# Altium footprint library JL_PCB.PCBLIB: 1112 footprints (part 20 of 71)
Each footprint in its own frame and in the unit in brackets; x right, y up, seen from the top. Pads: shape width x height; smd on the part's side, far side on the other; paste and mask are expansions set on the pad; w line width, h text height; cw(c..) or ccw(c..) is an arc to the next point about the centre after c.
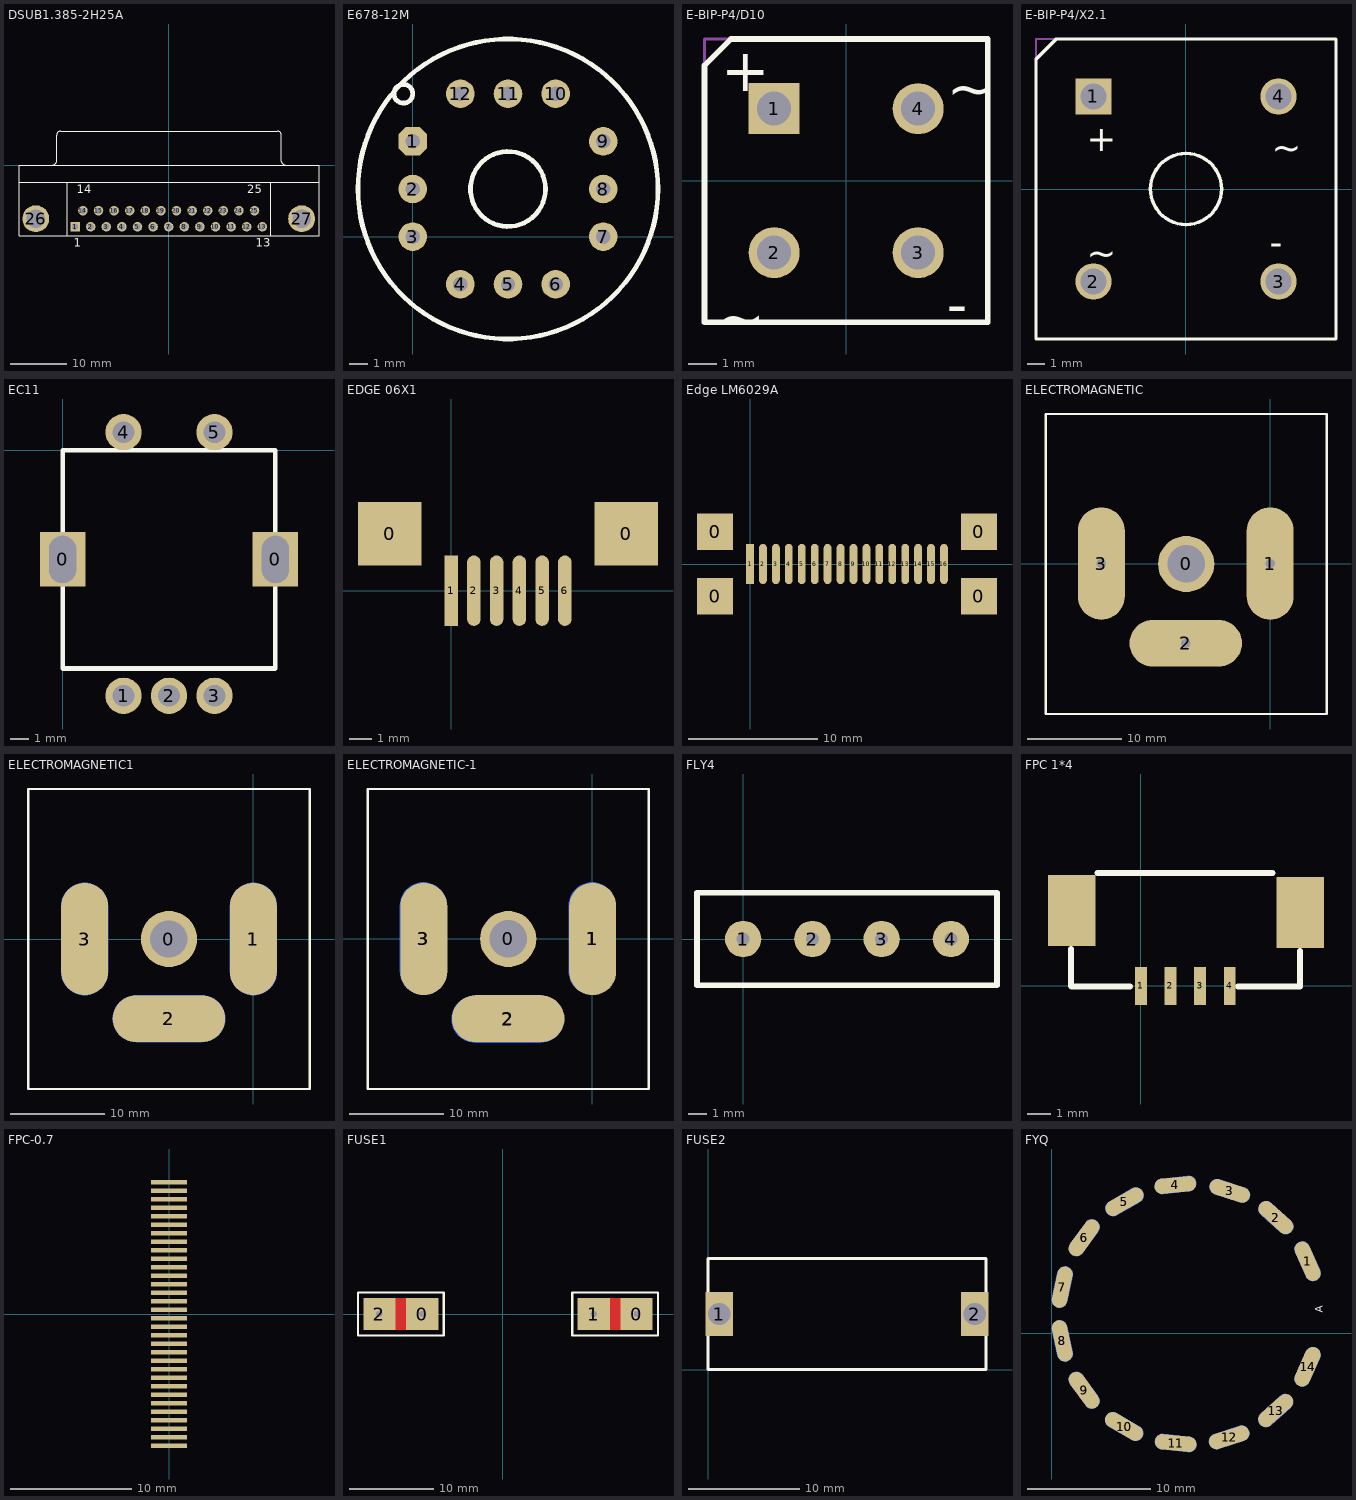
[diagram p19: the footprints below, top view; thin cyan lines are the x and y axes]

## DSUB1.385-2H25A [mm] "Connector; D Subminiature; 25 Position; Right Angle; Pitch 1.385 mm"
height 12.93
pads (27):
  rect 1.69x1.69 hole 1.09: 1(-16.566,-10.92)
  round 1.69 hole 1.09: 2(-13.805,-10.92) 3(-11.044,-10.92) 4(-8.283,-10.92) 5(-5.522,-10.92) 6(-2.761,-10.92) 7(0,-10.92) 8(2.761,-10.92) 9(5.522,-10.92) 10(8.283,-10.92) 11(11.044,-10.92) 12(13.805,-10.92) 13(16.566,-10.92) 14(-15.185,-8.08) 15(-12.424,-8.08) 16(-9.663,-8.08) 17(-6.902,-8.08) 18(-4.141,-8.08) 19(-1.38,-8.08) 20(1.381,-8.08) 21(4.142,-8.08) 22(6.903,-8.08) 23(9.664,-8.08) 24(12.425,-8.08) 25(15.186,-8.08)
  round 4.76 hole 3.26: 26(-23.526,-9.5) 27(23.526,-9.5)
TopOverlay:
  lines w0.2: -26.496,-3 26.604,-3 ; -20.541,0.005 ccw(c-20.541,0.7) -19.846,0.7 -19.846,5.3 ; -19.841,5.305 cw(c-19.146,5.305) -19.146,6 19.254,6 cw(c19.254,5.305) 19.949,5.305 ; -17.946,-12.5 -17.946,-3 ; 18.054,-12.5 18.054,-3 ; 19.954,5.3 19.954,0.7 ccw(c20.649,0.7) 20.649,0.005 ; -26.496,-12.5 -26.496,0 26.604,0 26.604,-12.5 -26.496,-12.5
  text "25" at 13.936,-4.975 h1.5
  text "14" at -16.31,-4.975 h1.5
  text "13" at 15.441,-14.475 h1.5
  text "1" at -16.816,-14.475 h1.5

## E678-12M [mil]
pads (12):
  oct 60x60 hole 30: 1(0,200)
  round 60 hole 30: 2(0,100) 3(0,0) 4(100,-100) 5(200,-100) 6(300,-100) 7(400,0) 8(400,100) 9(400,200) 10(300,300) 11(200,300) 12(100,300)
TopOverlay:
  circle w10: c200,100 r78.74
  circle w10: c-19.68,300 r19.68
  circle w10: c200,100 r314.96
3D body "User Library-Hamamatsu 6357 PMT Socket.step": height 403.36, standoff -143.49, extent -47.88,-145.88 441.88,343.89

## E-BIP-P4/D10 [mm] "Bridge Rectifier; 4 Terminals; Body 9.4 x 9.4 mm (typ); Pitch 5.08 mm"
height 9.91
pads (4):
  rect 1.8x1.8 hole 1.2: 1(-2.54,2.54)
  round 1.8 hole 1.2: 2(-2.54,-2.54) 3(2.54,-2.54) 4(2.54,2.54)
TopOverlay:
  lines w0.2: -5,-5 -5,4.064 -4.064,5 5,5 5,-5 -5,-5
  text "+" at -4.41,3.164 h1.5
  text "-" at 3.556,-5.08 h1.5
  text "~" at -4.572,-5.588 h1.5
  text "~" at 3.556,2.54 h1.5
Mechanical13:
  lines w0.1: -5,-5 -5,5 5,5 5,-5 -5,-5
3D body: height 9.91, standoff 0, extent -5,-5 5,5

## E-BIP-P4/X2.1 [mm] "Bridge Rectifier; 4 Terminals; Body 16.8 x 16.8 mm (typ); Pitch 10.67 mm"
height 6.35
pads (4):
  rect 2.1x2.1 hole 1.5: 1(-5.335,5.335)
  round 2.1 hole 1.5: 2(-5.335,-5.335) 3(5.335,-5.335) 4(5.335,5.335)
TopOverlay:
  circle w0.2: c0,0 r2.05
  lines w0.2: -8.65,-8.65 -8.65,7.474 -7.474,8.65 8.65,8.65 8.65,-8.65 -8.65,-8.65
  text "+" at -5.723,2.167 h1.5
  text "-" at 4.825,-3.809 h1.5
  text "~" at 4.945,1.659 h1.5
  text "~" at -5.723,-4.437 h1.5
Mechanical13:
  lines w0.1: -8.65,-8.65 8.65,-8.65 8.65,8.65 -8.65,8.65 -8.65,-8.65
3D body: height 6.35, standoff 0, extent -8.65,-8.65 8.65,8.65

## EC11 [mm]
pads (7):
  rect 2.5x3 hole 1.5 slot 2.6 at 90 deg: 0(0,-6) 0(11.7,-6)
  round 2 hole 1.2: 1(3.35,-13.5) 2(5.85,-13.5) 3(8.35,-13.5) 4(3.35,1) 5(8.35,1)
TopOverlay:
  lines w0.254: 0,-12 0,0 11.7,0 11.7,-12 0,-12
3D body "EC11.STEP": height 20.69, standoff -3.58, extent -0.21,-13.311 12.3,0.889

## EDGE 06X1 [mm]
pads (8):
  rect 2.8x2.8 smd: 0(-2.7,2.5) 0(7.7,2.5)
  rect 0.6x3.1 smd: 1(0,0)
  oval 0.6x3.1 smd: 2(1,0) 3(2,0) 4(3,0) 5(4,0) 6(5,0)

## Edge LM6029A [mm]
pads (20):
  rect 2.8x2.8 smd: 0(-2.7,-2.5) 0(-2.7,2.5) 0(17.7,-2.5) 0(17.7,2.5)
  rect 0.6x3.1 smd: 1(0,0)
  oval 0.6x3.1 smd: 2(1,0) 3(2,0) 4(3,0) 5(4,0) 6(5,0) 7(6,0) 8(7,0) 9(8,0) 10(9,0) 11(10,0) 12(11,0) 13(12,0) 14(13,0) 15(14,0) 16(15,0)

## ELECTROMAGNETIC [mm]
pads (4):
  round 6 hole 4: 0(-8.95,-0.05)
  oval 5x12 hole 1: 1(0,0) 3(-18,0)
  oval 12x5 hole 1: 2(-9,-8.5)
TopOverlay:
  lines w0.254: -23.95,-16.05 -23.95,15.95 6.05,15.95 6.05,-16.05 -23.95,-16.05
Mechanical1:
  lines w0.254: -18.45,3.9 -17.45,3.9 ; -12.7,-9.04 -12.7,-8.04 ; -0.5,3.5 0.5,3.5 ; -17.2,3.9 -18.7,3.9 -19.2,3.4 -19.2,-3.1 -19.2,-3.35 -18.7,-3.85 -17.2,-3.85 -16.7,-3.35 -16.7,3.4 ; -17.2,3.9 -16.7,3.4 ; -17.2,3.9 -16.7,3.4 ; -17.2,3.9 -16.7,3.4 ; -12.7,-7.79 -12.7,-9.29 -12.2,-9.79 -5.7,-9.79 -5.45,-9.79 -4.95,-9.29 -4.95,-7.79 -5.45,-7.29 -12.2,-7.29 ; -12.7,-7.79 -12.2,-7.29 ; -12.7,-7.79 -12.2,-7.29 ; -12.7,-7.79 -12.2,-7.29 ; 0.75,3.5 -0.75,3.5 -1.25,3 -1.25,-3.5 -1.25,-3.75 -0.75,-4.25 0.75,-4.25 1.25,-3.75 1.25,3 ; 0.75,3.5 1.25,3 ; 0.75,3.5 1.25,3 ; 0.75,3.5 1.25,3

## ELECTROMAGNETIC1 [mm]
pads (7):
  round 6 hole 4: 0(-9,0)
  oval 5x12 smd: 1(0,0) 3(-18,0)
  oval 5x12 smd far side: 1(0,0) 3(-18,0)
  oval 12x5 smd: 2(-9,-8.5)
  oval 12x5 smd far side: 2(-9,-8.5)
TopOverlay:
  lines w0.254: -24,-16 -24,16 6,16 6,-16 -24,-16
Mechanical1:
  lines w0.254: -18.5,4 -17.5,4 ; -13,-9 -13,-8 ; -0.5,4 0.5,4 ; -17.25,4 -18.75,4 -19.25,3.5 -19.25,-3 -19.25,-3.25 -18.75,-3.75 -17.25,-3.75 -16.75,-3.25 -16.75,3.5 ; -17.25,4 -16.75,3.5 ; -17.25,4 -16.75,3.5 ; -17.25,4 -16.75,3.5 ; -13,-7.75 -13,-9.25 -12.5,-9.75 -6,-9.75 -5.75,-9.75 -5.25,-9.25 -5.25,-7.75 -5.75,-7.25 -12.5,-7.25 ; -13,-7.75 -12.5,-7.25 ; -13,-7.75 -12.5,-7.25 ; -13,-7.75 -12.5,-7.25 ; 0.75,4 -0.75,4 -1.25,3.5 -1.25,-3 -1.25,-3.25 -0.75,-3.75 0.75,-3.75 1.25,-3.25 1.25,3.5 ; 0.75,4 1.25,3.5 ; 0.75,4 1.25,3.5 ; 0.75,4 1.25,3.5

## ELECTROMAGNETIC-1 [mm]
pads (7):
  round 6 hole 4: 0(-8.95,-0.05)
  oval 5x12 smd far side: 1(0,0) 3(-18,0)
  oval 5x12 smd: 1(0.05,-0.05) 3(-17.95,-0.05)
  oval 12x5 smd far side: 2(-9,-8.6)
  oval 12x5 smd: 2(-8.95,-8.55)
TopOverlay:
  lines w0.254: -23.95,-16.05 6.05,-16.05 6.05,15.95 -23.95,15.95 -23.95,-16.05
Mechanical1:
  lines w0.254: -18.45,3.9 -17.45,3.9 ; -12.7,-9.04 -12.7,-8.04 ; -0.5,3.5 0.5,3.5 ; -17.2,3.9 -16.7,3.4 ; -17.2,3.9 -16.7,3.4 ; -17.2,3.9 -16.7,3.4 ; -17.2,3.9 -18.7,3.9 -19.2,3.4 -19.2,-3.1 -19.2,-3.35 -18.7,-3.85 -17.2,-3.85 -16.7,-3.35 -16.7,3.4 ; -12.7,-7.79 -12.2,-7.29 ; -12.7,-7.79 -12.2,-7.29 ; -12.7,-7.79 -12.2,-7.29 ; -12.7,-7.79 -12.7,-9.29 -12.2,-9.79 -5.7,-9.79 -5.45,-9.79 -4.95,-9.29 -4.95,-7.79 -5.45,-7.29 -12.2,-7.29 ; 0.75,3.5 1.25,3 ; 0.75,3.5 1.25,3 ; 0.75,3.5 1.25,3 ; 0.75,3.5 -0.75,3.5 -1.25,3 -1.25,-3.5 -1.25,-3.75 -0.75,-4.25 0.75,-4.25 1.25,-3.75 1.25,3

## FLY4 [mm]
pads (4):
  round 2 hole 0.711: 1(0,0) 2(3.81,0) 3(7.62,0) 4(11.43,0)
TopOverlay:
  lines w0.305: -2.54,-2.54 -2.54,2.54 13.97,2.54 13.97,-2.54 -2.54,-2.54

## FPC 1*4 [mm]
pads (6):
  rect 0.5x1.6 smd: 1(0,0) 2(1.25,0) 3(2.5,0) 4(3.75,0)
  rect 2x3 smd: ""(-2.921,3.175) ""(6.731,3.099)
TopOverlay:
  lines w0.254: -2.946,1.549 -2.946,0 -2.921,-0.025 -0.457,-0.025 ; -1.829,4.75 5.563,4.75 ; 4.089,-0.025 6.706,-0.025 6.706,1.473

## FPC-0.7 [mm]
pads (32):
  rect 3x0.4 smd: 1(0,10.85) 2(0,10.15) 3(0,9.45) 4(0,8.75) 5(0,8.05) 6(0,7.35) 7(0,6.65) 8(0,5.95) 9(0,5.25) 10(0,4.55) 11(0,3.85) 12(0,3.15) 13(0,2.45) 14(0,1.75) 15(0,1.05) 16(0,0.35) 17(0,-0.35) 18(0,-1.05) 19(0,-1.75) 20(0,-2.45) 21(0,-3.15) 22(0,-3.85) 23(0,-4.55) 24(0,-5.25) 25(0,-5.95) 26(0,-6.65) 27(0,-7.35) 28(0,-8.05) 29(0,-8.75) 30(0,-9.45) 31(0,-10.15) 32(0,-10.85)

## FUSE1 [mil]
pads (4):
  rect 150x150 hole 30: 0(-375,0) 0(625,0) 1(425,0) 2(-575,0)
TopLayer:
  rectangle: 475,-75 575,75
  rectangle: -525,-75 -425,75
BottomLayer:
  rectangle: 475,-75 575,75
  rectangle: -525,-75 -425,75
TopOverlay:
  lines w10: -675,-100 -675,100 -275,100 -275,-100 -675,-100 ; 325,-100 325,100 725,100 725,-100 325,-100
3D body "User Library-FUSECLIP.step": height 430.55, standoff -137.2, extent -586.32,-151.63 -365.69,151.63
3D body "User Library-FUSECLIP.step": height 430.55, standoff -137.2, extent 414.69,-153 635.31,150.26
3D body "User Library-Fuse Slow-Blow.step": height 440.96, standoff 188.96, extent -621,-130 629,122

## FUSE2 [mm]
pads (2):
  rect 2.5x4 hole 2: 1(1,5) 2(24,5)
TopOverlay:
  lines w0.254: 0,0 0,10 25,10 25,0 0,0
3D body "User Library-20mm_fuse.step": height 10.5, standoff 5.5, extent 2.598,2.362 22.598,7.362
3D body "User Library-ZHL30.step": height 11.52, standoff -1.85, extent 0.348,0.228 24.748,9.628

## FYQ [mil]
pads (42):
  oval 134x50 smd rot 114: 1(818.12,229.8)
  oval 134x50 smd far side rot 114: 1(818.12,229.8)
  oval 104x20 on Mech1 rot 114: 1(818.12,229.79)
  oval 134x50 smd rot 138: 2(716.69,369.4)
  oval 134x50 smd far side rot 138: 2(716.69,369.4)
  oval 104x20 on Mech1 rot 138: 2(716.69,369.41)
  oval 134x50 smd rot 162: 3(569,455)
  oval 134x50 smd far side rot 162: 3(569,455)
  oval 104x20 on Mech1 rot 162: 3(569,455)
  oval 134x50 smd rot 6: 4(395,474)
  oval 134x50 smd far side rot 6: 4(395,474)
  oval 104x20 on Mech1 rot 6: 4(395,474)
  oval 134x50 smd rot 30: 5(232,420)
  oval 134x50 smd far side rot 30: 5(232,420)
  oval 104x20 on Mech1 rot 30: 5(232,420)
  oval 134x50 smd rot 54: 6(103,305)
  oval 134x50 smd far side rot 54: 6(103,305)
  oval 104x20 on Mech1 rot 54: 6(103,305)
  oval 134x50 smd rot 78: 7(33,147)
  oval 134x50 smd far side rot 78: 7(33,147)
  oval 104x20 on Mech1 rot 78: 7(33,147)
  oval 134x50 smd rot 102: 8(33,-25)
  oval 134x50 smd far side rot 102: 8(33,-25)
  oval 104x20 on Mech1 rot 102: 8(33,-25)
  oval 134x50 smd rot 126: 9(103,-183)
  oval 134x50 smd far side rot 126: 9(103,-183)
  oval 104x20 on Mech1 rot 126: 9(103,-183)
  oval 134x50 smd rot 150: 10(231,-299)
  oval 134x50 smd far side rot 150: 10(231,-299)
  oval 104x20 on Mech1 rot 150: 10(231,-299)
  oval 134x50 smd rot 174: 11(396,-352)
  oval 134x50 smd far side rot 174: 11(396,-352)
  oval 104x20 on Mech1 rot 174: 11(396,-352)
  oval 134x50 smd rot 18: 12(567,-334)
  oval 134x50 smd far side rot 18: 12(567,-334)
  oval 104x20 on Mech1 rot 18: 12(567,-334)
  oval 134x50 smd rot 42: 13(716,-248)
  oval 134x50 smd far side rot 42: 13(716,-248)
  oval 104x20 on Mech1 rot 42: 13(716,-248)
  oval 134x50 smd rot 66: 14(818,-108)
  oval 134x50 smd far side rot 66: 14(818,-108)
  oval 104x20 on Mech1 rot 66: 14(818,-108)
TopOverlay:
  text "A" at 867,65 h25